# Altium footprint library 20-Switches.PcbLib: 110 footprints (part 2 of 7)
Each footprint in its own frame and in the unit in brackets; x right, y up, seen from the top. Pads: shape width x height; smd on the part's side, far side on the other; paste and mask are expansions set on the pad; w line width, h text height; cw(c..) or ccw(c..) is an arc to the next point about the centre after c.
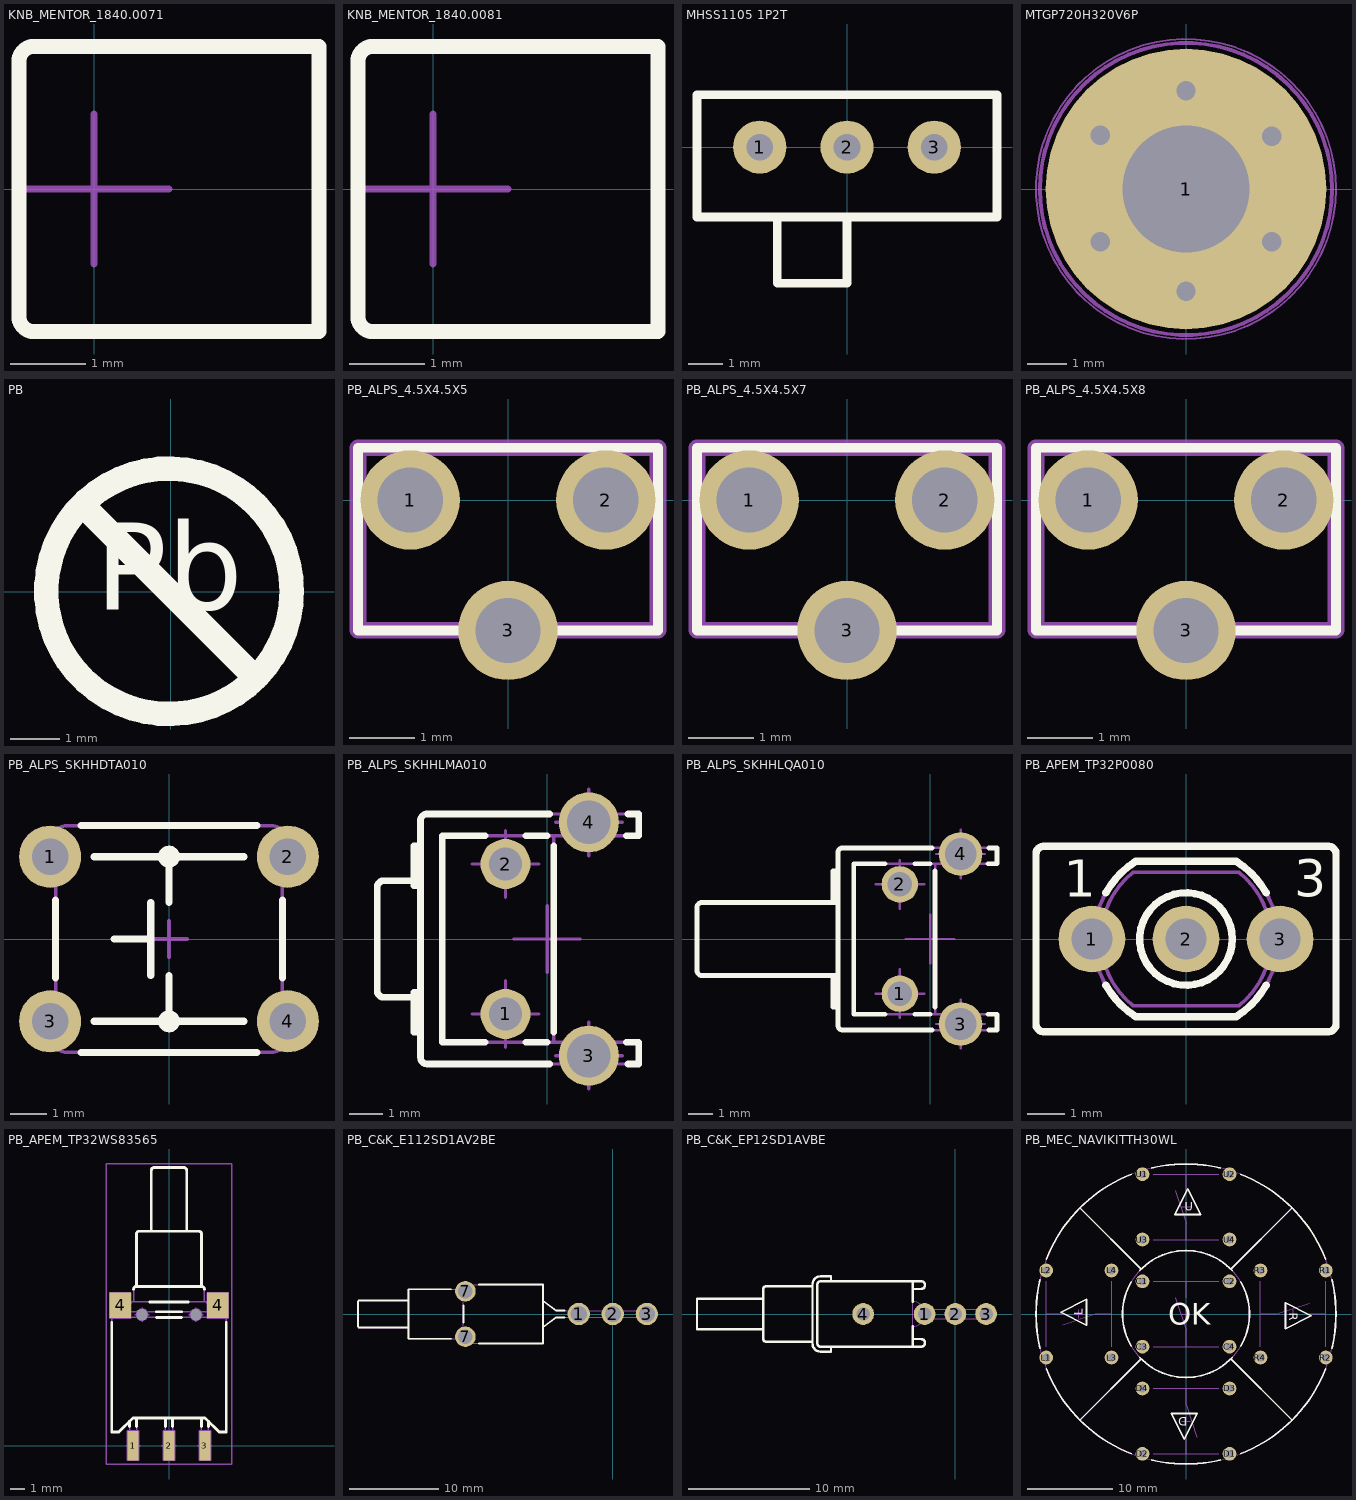
[diagram p1: the footprints below, top view; thin cyan lines are the x and y axes]

## KNB_MENTOR_1840.0071 [mm] "Yellow Knob For MENTOR Push-Button Switch (Dia. 3.8mm L=4mm)"
height 3.8
Top Overlay:
  lines w0.2: -1,-1.7 ccw(c-0.8,-1.7) -0.8,-1.9 3,-1.9 3,1.9 -0.8,1.9 ccw(c-0.8,1.7) -1,1.7 -1,-1.7
Mechanical 8:
  lines w0.1: -1,0 0,0 ; 0,-1 0,0 ; 0,1 0,0 ; 1,0 0,0
Mechanical 14:
  lines w0.1: -1,-1.7 ccw(c-0.8,-1.7) -0.8,-1.9 3,-1.9 3,1.9 -0.8,1.9 ccw(c-0.8,1.7) -1,1.7 -1,-1.7
3D body "KNB_MENTOR_1840.0071.stp": height 6.95, standoff 3.15, extent -1,-1.9 3,1.9

## KNB_MENTOR_1840.0081 [mm] "Green Knob For MENTOR Push-Button Switch (Dia. 3.8mm L=4mm)"
height 3.8
Top Overlay:
  lines w0.2: -1,-1.7 ccw(c-0.8,-1.7) -0.8,-1.9 3,-1.9 3,1.9 -0.8,1.9 ccw(c-0.8,1.7) -1,1.7 -1,-1.7
Mechanical 8:
  lines w0.1: -1,0 0,0 ; 0,-1 0,0 ; 0,1 0,0 ; 1,0 0,0
Mechanical 14:
  lines w0.1: -1,-1.7 ccw(c-0.8,-1.7) -0.8,-1.9 3,-1.9 3,1.9 -0.8,1.9 ccw(c-0.8,1.7) -1,1.7 -1,-1.7
3D body "KNB_MENTOR_1840.0081.stp": height 6.95, standoff 3.15, extent -1,-1.9 3,1.9

## MHSS1105 1P2T [mil]
height 149.61
pads (3):
  round 60 hole 30: 1(-98.43,0) 2(0,0) 3(98.43,0)
Top Overlay:
  lines w10: -78.74,-78.74 -78.74,-153.54 0,-153.54 0,-78.74 ; -169.29,-78.74 -169.29,59.06 169.29,59.06 169.29,-78.74 -169.29,-78.74
3D body "mhss1105-1p2t.stp": height 137.8, standoff -118.11, extent -167.32,-155.5 167.33,61.03

## MTGP720H320V6P [mm]
pads (1):
  round 7.2 hole 3.25: 1(0,0)
via 2.2,-1.35 diameter 1 hole 0.5
via 0,-2.625 diameter 1 hole 0.5
via 2.2,1.35 diameter 1 hole 0.5
via 0,2.525 diameter 1 hole 0.5
via -2.2,1.375 diameter 1 hole 0.5
via -2.2,-1.35 diameter 1 hole 0.5
Mechanical 8:
  circle w0.1: c0,0 r3.75
  circle w0.1: c0,0 r2.6
  lines w0.1: -2.657,1.625 -2.224,1.375 ; -2.632,-1.6 -2.199,-1.35 ; -2.474,0.942 -2.224,1.375 ; -2.449,-0.917 -2.199,-1.35 ; -1.974,1.808 -2.224,1.375 ; -1.949,-1.783 -2.199,-1.35 ; -1.791,1.125 -2.224,1.375 ; -1.766,-1.1 -2.199,-1.35 ; -0.5,-2.625 0,-2.625 ; -0.5,0 0,0 ; -0.5,2.525 0,2.525 ; 0,-3.125 0,-2.625 ; 0,-2.125 0,-2.625 ; 0,-0.5 0,0 ; 0,0.5 0,0 ; 0,2.025 0,2.525 ; 0,3.025 0,2.525 ; 0.5,-2.625 0,-2.625 ; 0.5,0 0,0 ; 0.5,2.525 0,2.525 ; 1.766,-1.1 2.199,-1.35 ; 1.766,1.1 2.199,1.35 ; 1.949,-1.783 2.199,-1.35 ; 1.949,1.783 2.199,1.35 ; 2.449,-0.917 2.199,-1.35 ; 2.449,0.917 2.199,1.35 ; 2.632,-1.6 2.199,-1.35 ; 2.632,1.6 2.199,1.35
Mechanical 14:
  circle w0.1: c0,0 r3.75
Mechanical 15:
  circle w0.05: c0,0 r3.85
3D body "mtgp720h320v6p.stp": height 0.1, standoff -1.75, extent -3.627,-3.627 3.628,3.628

## PB [mm]
Top Overlay:
  circle w0.5: c-0.031,0.013 r2.5
  lines w0.5: -1.737,1.719 1.675,-1.693
  text "Pb" at -1.536,-0.948 h3.05
3D body "pb.stp": height 0.02, standoff 0, extent -2.725,-2.725 2.725,2.725

## PB_ALPS_4.5X4.5X5 [mm]
height 3.8
pads (3):
  round 1.524 hole 1: 1(-1.5,0) 2(1.5,0) 3(0,-2)
Top Overlay:
  lines w0.15: -2.3,-2 2.3,-2 2.3,0.8 -2.3,0.8 -2.3,-2
Mechanical 14:
  lines w0.254: -2.3,-2 -2.3,0.8 2.3,0.8 2.3,-2 -2.3,-2
Mechanical 15:
  lines w0.254: -2.3,-2 2.3,-2 2.3,0.8 -2.3,0.8 -2.3,-2
3D body "4_5x4_5-rj.stp": height 4.5, standoff -1.8, extent -2.25,-4.35 2.25,0.8

## PB_ALPS_4.5X4.5X7 [mm]
height 3.8
pads (3):
  round 1.524 hole 1: 1(-1.5,0) 2(1.5,0) 3(0,-2)
Top Overlay:
  lines w0.15: -2.3,-2 -2.3,0.8 2.3,0.8 2.3,-2 -2.3,-2
Mechanical 14:
  lines w0.254: -2.3,-2 2.3,-2 2.3,0.8 -2.3,0.8 -2.3,-2
Mechanical 15:
  lines w0.254: -2.3,-2 -2.3,0.8 2.3,0.8 2.3,-2 -2.3,-2
3D body "4_5x4_5-rj.stp": height 4.5, standoff -1.8, extent -2.25,-4.35 2.25,0.8

## PB_ALPS_4.5X4.5X8 [mm]
height 3.8
pads (3):
  round 1.524 hole 1: 1(-1.5,0) 2(1.5,0) 3(0,-2)
Top Overlay:
  lines w0.15: -2.3,-2 -2.3,0.8 2.3,0.8 2.3,-2 -2.3,-2
Mechanical 14:
  lines w0.254: -2.3,-2 2.3,-2 2.3,0.8 -2.3,0.8 -2.3,-2
Mechanical 15:
  lines w0.254: -2.3,-2 -2.3,0.8 2.3,0.8 2.3,-2 -2.3,-2
3D body "4_5x4_5-rj.stp": height 4.5, standoff -1.8, extent -2.25,-4.35 2.25,0.8

## PB_ALPS_SKHHDTA010 [mm] "6x6mm Model, 13mm Stem Height Vertical Pushbutton Switch, ALPS SKHH Series"
height 13
pads (4):
  round 1.7 hole 1: 1(-3.25,2.25) 2(3.25,2.25) 3(-3.25,-2.25) 4(3.25,-2.25)
Top Overlay:
  circle w0.2: c0,2.25 r0.2
  circle w0.2: c0,-2.25 r0.2
  lines w0.2: -3.1,-1.059 -3.1,1.059 ; -2.403,-3.1 2.403,-3.1 ; -2.403,3.1 2.403,3.1 ; -2.05,-2.25 2.05,-2.25 ; -2.05,2.25 2.05,2.25 ; -1.5,0 -0.5,0 ; -0.5,-1 -0.5,1 ; 0,-2.25 0,-1 ; 0,1 0,2.25 ; 3.1,-1.059 3.1,1.059
Mechanical 8:
  lines w0.1: -3.75,-2.25 -3.25,-2.25 ; -3.75,2.25 -3.25,2.25 ; -3.25,-2.75 -3.25,-2.25 ; -3.25,-1.75 -3.25,-2.25 ; -3.25,1.75 -3.25,2.25 ; -3.25,2.75 -3.25,2.25 ; -2.75,-2.25 -3.25,-2.25 ; -2.75,2.25 -3.25,2.25 ; -0.5,0 0,0 ; 0,-0.5 0,0 ; 0,0.5 0,0 ; 0.5,0 0,0 ; 2.75,-2.25 3.25,-2.25 ; 2.75,2.25 3.25,2.25 ; 3.25,-2.75 3.25,-2.25 ; 3.25,-1.75 3.25,-2.25 ; 3.25,1.75 3.25,2.25 ; 3.25,2.75 3.25,2.25 ; 3.75,-2.25 3.25,-2.25 ; 3.75,2.25 3.25,2.25
Mechanical 14:
  lines w0.1: -3.1,-2.6 -3.95,-2.6 -3.95,-1.9 -3.1,-1.9 ; -3.1,1.9 -3.95,1.9 -3.95,2.6 -3.096,2.6 ; -2.05,-2.25 2.05,-2.25 ; -2.05,2.25 2.05,2.25 ; -1.5,0 -0.5,0 ; -0.5,-1 -0.5,1 ; 0,-2.25 0,-1 ; 0,1 0,2.25 ; 3.1,-2.6 3.95,-2.6 3.95,-1.9 3.1,-1.9 ; 3.1,1.9 3.95,1.9 3.95,2.6 3.1,2.6 ; -3.1,-2.8 ccw(c-2.8,-2.8) -2.8,-3.1 2.8,-3.1 ccw(c2.8,-2.8) 3.1,-2.8 3.1,2.8 ccw(c2.8,2.8) 2.8,3.1 -2.8,3.1 ccw(c-2.8,2.8) -3.1,2.8 -3.1,-2.8
3D body "PB_ALPS_SKHHDTA010.stp": height 13, standoff -3.5, extent -3.95,-3.1 3.95,3.1

## PB_ALPS_SKHHLMA010 [mm] "Body 6x6mm, Stem height 3.85mm, Horizontal Pushbutton Switch, ALPS Serie SKHH"
height 7.4
pads (4):
  round 1.5 hole 1: 1(-1.25,-2.25) 2(-1.25,2.25)
  round 1.8 hole 1.3: 3(1.25,-3.5) 4(1.25,3.5)
Top Overlay:
  lines w0.2: -4,-1.75 -4.9,-1.75 cw(c-4.9,-1.55) -5.1,-1.55 -5.1,1.55 cw(c-4.9,1.55) -4.9,1.75 -4,1.75 ; -3.8,-2.8 -4,-2.8 -4,-1.6 -3.8,-1.6 ; -3.8,1.6 -4,1.6 -4,2.8 -3.8,2.8 ; -1.866,-3.1 -3.15,-3.1 -3.15,3.1 -1.866,3.1 ; -0.634,-3.1 0,-3.1 ; -0.634,3.1 0,3.1 ; 0.076,-3.75 -3.6,-3.75 cw(c-3.6,-3.55) -3.8,-3.55 -3.8,3.55 cw(c-3.6,3.55) -3.6,3.75 0.076,3.75 ; 0.2,-2.8 0.2,2.8 ; 2.381,-3.1 2.75,-3.1 2.75,-3.75 2.424,-3.75 ; 2.381,3.1 2.75,3.1 2.75,3.75 2.424,3.75
Mechanical 8:
  lines w0.1: -2.25,-2.25 -1.25,-2.25 ; -2.25,2.25 -1.25,2.25 ; -1.25,-3.25 -1.25,-2.25 ; -1.25,-1.25 -1.25,-2.25 ; -1.25,1.25 -1.25,2.25 ; -1.25,3.25 -1.25,2.25 ; -1,0 0,0 ; -0.25,-2.25 -1.25,-2.25 ; -0.25,2.25 -1.25,2.25 ; 0,-1 0,0 ; 0,1 0,0 ; 0.25,-3.5 1.25,-3.5 ; 0.25,3.5 1.25,3.5 ; 1,0 0,0 ; 1.25,-4.5 1.25,-3.5 ; 1.25,-2.5 1.25,-3.5 ; 1.25,2.5 1.25,3.5 ; 1.25,4.5 1.25,3.5 ; 2.25,-3.5 1.25,-3.5 ; 2.25,3.5 1.25,3.5
Mechanical 14:
  lines w0.1: -4,-1.75 -4.9,-1.75 cw(c-4.9,-1.55) -5.1,-1.55 -5.1,1.55 cw(c-4.9,1.55) -4.9,1.75 -4,1.75 ; -3.8,-2.8 -4,-2.8 -4,-1.6 -3.8,-1.6 ; -3.8,1.6 -4,1.6 -4,2.8 -3.8,2.8 ; 0.2,-3.1 -3.15,-3.1 -3.15,3.1 0.2,3.1 ; 0.2,-3.1 2.75,-3.1 2.75,-3.75 -3.6,-3.75 cw(c-3.6,-3.55) -3.8,-3.55 -3.8,3.55 cw(c-3.6,3.55) -3.6,3.75 2.75,3.75 2.75,3.1 0.2,3.1 ; 0.2,-3.1 0.2,3.1
3D body "PB_ALPS_SKHHLMA010.stp": height 7.1, standoff -3.5, extent -5.1,-3.75 2.75,3.75

## PB_ALPS_SKHHLQA010 [mm] "Body 6x6mm, Stem height 8.35mm, Horizontal Pushbutton Switch, ALPS Serie SKHH"
height 7.4
pads (4):
  round 1.5 hole 1: 1(-1.25,-2.25) 2(-1.25,2.25)
  round 1.8 hole 1.3: 3(1.25,-3.5) 4(1.25,3.5)
Top Overlay:
  lines w0.2: -9.6,1.27 -9.6,-1.3 ccw(c-9.4,-1.3) -9.4,-1.5 -3.8,-1.5 ; -9.6,1.3 cw(c-9.4,1.3) -9.4,1.5 -3.8,1.5 ; -3.8,-2.8 -4,-2.8 -4,-1.6 -3.8,-1.6 ; -3.8,1.6 -4,1.6 -4,2.8 -3.8,2.8 ; -1.866,-3.1 -3.15,-3.1 -3.15,3.1 -1.866,3.1 ; -0.634,-3.1 0,-3.1 ; -0.634,3.1 0,3.1 ; 0.076,-3.75 -3.6,-3.75 cw(c-3.6,-3.55) -3.8,-3.55 -3.8,3.55 cw(c-3.6,3.55) -3.6,3.75 0.076,3.75 ; 0.2,-2.8 0.2,2.8 ; 2.381,-3.1 2.75,-3.1 2.75,-3.75 2.424,-3.75 ; 2.381,3.1 2.75,3.1 2.75,3.75 2.424,3.75
Mechanical 8:
  lines w0.1: -2.25,-2.25 -1.25,-2.25 ; -2.25,2.25 -1.25,2.25 ; -1.25,-3.25 -1.25,-2.25 ; -1.25,-1.25 -1.25,-2.25 ; -1.25,1.25 -1.25,2.25 ; -1.25,3.25 -1.25,2.25 ; -1,0 0,0 ; -0.25,-2.25 -1.25,-2.25 ; -0.25,2.25 -1.25,2.25 ; 0,-1 0,0 ; 0,1 0,0 ; 0.25,-3.5 1.25,-3.5 ; 0.25,3.5 1.25,3.5 ; 1,0 0,0 ; 1.25,-4.5 1.25,-3.5 ; 1.25,-2.5 1.25,-3.5 ; 1.25,2.5 1.25,3.5 ; 1.25,4.5 1.25,3.5 ; 2.25,-3.5 1.25,-3.5 ; 2.25,3.5 1.25,3.5
Mechanical 14:
  lines w0.1: -3.8,-2.8 -4,-2.8 -4,-1.6 -3.8,-1.6 ; -3.8,-1.5 -9.4,-1.5 cw(c-9.4,-1.3) -9.6,-1.3 -9.6,1.3 cw(c-9.4,1.3) -9.4,1.5 -3.8,1.5 ; -3.8,1.6 -4,1.6 -4,2.8 -3.8,2.8 ; 0.2,-3.1 0.2,3.1 ; 0.2,-3.1 2.75,-3.1 2.75,-3.75 -3.6,-3.75 cw(c-3.6,-3.55) -3.8,-3.55 -3.8,3.55 cw(c-3.6,3.55) -3.6,3.75 2.75,3.75 2.75,3.1 0.2,3.1 ; 0.2,-3.1 -3.15,-3.1 -3.15,3.1 0.2,3.1
3D body "PB_ALPS_SKHHLQA010.stp": height 7.1, standoff -3.5, extent -9.6,-3.75 2.75,3.75

## PB_APEM_TP32P0080 [mm] "SPDT Momentary Push-Button Switch - Straight PCB - APEM TP Serie"
height 17.75
pads (3):
  round 1.8 hole 1.1: 1(-2.54,0) 2(0,0) 3(2.54,0)
Top Overlay:
  circle w0.2: c0,0 r1.25
  lines w0.2: -2.168,-1.246 ccw(c0,0) -1.356,-2.1 1.356,-2.1 ccw(c0,0) 2.168,-1.246 ; -2.168,1.246 cw(c0,0) -1.356,2.1 1.356,2.1 cw(c0,0) 2.168,1.246 ; -4.05,-2.3 ccw(c-3.85,-2.3) -3.85,-2.5 3.85,-2.5 ccw(c3.85,-2.3) 4.05,-2.3 4.05,2.3 ccw(c3.85,2.3) 3.85,2.5 -3.85,2.5 ccw(c-3.85,2.3) -4.05,2.3 -4.05,-2.3
  text "1" at -3.302,1.143 h1
  text "3" at 2.921,1.143 h1
Mechanical 8:
  lines w0.1: -3.04,0 -2.54,0 ; -2.54,-0.5 -2.54,0 ; -2.54,0.5 -2.54,0 ; -2.04,0 -2.54,0 ; -0.5,0 0,0 ; 0,-0.5 0,0 ; 0,0.5 0,0 ; 0.5,0 0,0 ; 2.04,0 2.54,0 ; 2.54,-0.5 2.54,0 ; 2.54,0.5 2.54,0 ; 3.04,0 2.54,0
Mechanical 14:
  circle w0.1: c0,0 r1.25
  lines w0.1: -4.05,-2.3 ccw(c-3.85,-2.3) -3.85,-2.5 3.85,-2.5 ccw(c3.85,-2.3) 4.05,-2.3 4.05,2.3 ccw(c3.85,2.3) 3.85,2.5 -3.85,2.5 ccw(c-3.85,2.3) -4.05,2.3 -4.05,-2.3 ; -1.432,-1.8 cw(c0,0) -1.432,1.8 1.432,1.8 cw(c0,0) 1.432,-1.8 -1.432,-1.8 ; -1.356,-2.1 cw(c0,0) -1.356,2.1 1.356,2.1 cw(c0,0) 1.356,-2.1 -1.356,-2.1
  text "1" at -3.303,1.144 h1
  text "3" at 2.92,1.144 h1
3D body "PB_APEM_TP32P0080.stp": height 17.75, standoff -3.3, extent -4.05,-2.5 4.05,2.5

## PB_APEM_TP32WS83565 [mm] "Horizontal Surface Mount Tiny Washable Pushbutton Switches With Positioning Pins, APEM TP Series"
height 5.55
pads (7):
  rect 0.8x2.1 smd: 1(-2.54,0) 2(0,0) 3(2.54,0)
  rect 1.5x1.8 smd: 4(-3.45,9.91) 4(3.45,9.91)
  round 0.5 hole 0.8 unplated: MEC(-1.905,9.26) MEC(1.905,9.26)
Top Overlay:
  lines w0.2: -4.05,8.71 -4.05,0.96 -3.55,0.96 -2.55,1.96 2.55,1.96 3.55,0.96 4.05,0.96 4.05,8.71 ; -2.79,1.35 -2.79,1.72 ; -2.5,11.06 cw(c-2.3,11.06) -2.3,11.26 ; -2.29,1.35 -2.29,1.953 ; -1.364,10.16 1.364,10.16 ; -1.25,15.16 -1.25,19.46 cw(c-1.05,19.46) -1.05,19.66 1.05,19.66 cw(c1.05,19.46) 1.25,19.46 1.25,15.16 ; -0.874,9.06 0.874,9.06 ; -0.874,9.46 0.874,9.46 ; -0.25,1.35 -0.25,1.953 ; 0.25,1.35 0.25,1.953 ; 2.29,1.35 2.29,1.953 ; 2.5,11.06 ccw(c2.3,11.06) 2.3,11.26 ; 2.79,1.35 2.79,1.72 ; -2.3,11.26 2.3,11.26 ; -2.3,11.26 -2.3,14.96 cw(c-2.1,14.96) -2.1,15.16 2.1,15.16 cw(c2.1,14.96) 2.3,14.96 2.3,11.26
Mechanical 8:
  circle w0.1: c1.905,9.26 r0.4
  circle w0.1: c-1.905,9.26 r0.4
  lines w0.1: -3.95,9.91 -3.45,9.91 ; -3.45,9.41 -3.45,9.91 ; -3.45,10.41 -3.45,9.91 ; -3.04,0 -2.54,0 ; -2.95,9.91 -3.45,9.91 ; -2.54,-0.5 -2.54,0 ; -2.54,0.5 -2.54,0 ; -2.405,9.26 -1.905,9.26 ; -2.04,0 -2.54,0 ; -1.905,8.76 -1.905,9.26 ; -1.905,9.76 -1.905,9.26 ; -1.405,9.26 -1.905,9.26 ; -0.5,0 0,0 ; 0,-0.5 0,0 ; 0,0.5 0,0 ; 0.5,0 0,0 ; 1.405,9.26 1.905,9.26 ; 1.905,8.76 1.905,9.26 ; 1.905,9.76 1.905,9.26 ; 2.04,0 2.54,0 ; 2.405,9.26 1.905,9.26 ; 2.54,-0.5 2.54,0 ; 2.54,0.5 2.54,0 ; 2.95,9.91 3.45,9.91 ; 3.04,0 2.54,0 ; 3.45,9.41 3.45,9.91 ; 3.45,10.41 3.45,9.91 ; 3.95,9.91 3.45,9.91 ; -4.2,9.01 -4.2,10.81 -2.7,10.81 -2.7,9.01 -4.2,9.01 ; -2.94,-1.05 -2.94,1.05 -2.14,1.05 -2.14,-1.05 -2.94,-1.05 ; -0.4,-1.05 0.4,-1.05 0.4,1.05 -0.4,1.05 -0.4,-1.05 ; 2.14,-1.05 2.94,-1.05 2.94,1.05 2.14,1.05 2.14,-1.05 ; 2.7,9.01 2.7,10.81 4.2,10.81 4.2,9.01 2.7,9.01
Mechanical 14:
  lines w0.1: -4.05,8.859 cw(c-3.85,8.86) -3.85,9.06 ; -4.05,8.86 -4.05,0.96 -3.55,0.96 -2.55,1.96 2.55,1.96 3.55,0.96 4.05,0.96 4.05,8.86 ; -3.95,9.46 3.95,9.46 ; -2.95,9.46 -2.95,10.56 -3.95,10.56 -3.95,9.06 3.95,9.06 3.95,10.56 2.95,10.56 2.95,9.46 ; -2.85,9.46 -2.65,10.16 2.65,10.16 2.85,9.46 ; -2.79,1.72 -2.79,-0.799 -2.29,-0.799 -2.29,1.953 ; -2.5,10.16 -2.5,11.06 cw(c-2.3,11.06) -2.3,11.26 ; -1.25,15.16 -1.25,19.46 cw(c-1.05,19.46) -1.05,19.66 1.05,19.66 cw(c1.05,19.46) 1.25,19.46 1.25,15.16 ; -0.25,1.953 -0.25,-0.799 0.25,-0.799 0.25,1.953 ; 2.29,1.953 2.29,-0.799 2.79,-0.799 2.79,1.72 ; 2.5,10.16 2.5,11.06 ccw(c2.3,11.06) 2.3,11.26 ; 3.85,9.06 cw(c3.85,8.86) 4.05,8.859 ; -2.3,11.26 2.3,11.26 ; -2.3,11.26 -2.3,14.96 cw(c-2.1,14.96) -2.1,15.16 2.1,15.16 cw(c2.1,14.96) 2.3,14.96 2.3,11.26
Mechanical 15:
  lines w0.1: -4.45,-1.3 4.45,-1.3 4.45,19.91 -4.45,19.91 -4.45,-1.3
3D body "PB_APEM_TP32WS83565.stp": height 5.6, standoff -1, extent -4.05,-0.799 4.05,19.66

## PB_C&K_E112SD1AV2BE [mm] "SPDT Toggle Switch - Vertical Right Angled PCB Mounting, Unthreaded Bushing, C&K E010 Series"
height 12.7
pads (5):
  round 2.5 hole 1.8: 1(-3.81,0) 2(0,0) 3(3.81,0)
  round 2.3 hole 1.6: 7(-16.51,-2.54) 7(-16.51,2.54)
Top Overlay:
  lines w0.2: -22.885,-1.525 -28.425,-1.525 -28.525,-1.425 -28.525,1.425 -28.425,1.525 -22.885,1.525 ; -18.092,-2.78 -22.885,-2.78 ; -18.092,2.78 -22.885,2.78 ; -16.715,-0.953 -16.715,0.953 ; -14.986,-3.3 -7.825,-3.3 -7.825,3.3 -14.986,3.3 ; -7.825,-1.5 -6.332,-0.38 -5.416,-0.38 ; -7.825,1.5 -6.332,0.38 -5.416,0.38 ; -22.885,-2.78 -22.885,2.78 ; -22.885,-2.78 -22.885,2.78
Mechanical 8:
  lines w0.1: -17.51,-2.54 -16.51,-2.54 ; -17.51,2.54 -16.51,2.54 ; -16.51,-3.54 -16.51,-2.54 ; -16.51,-1.54 -16.51,-2.54 ; -16.51,1.54 -16.51,2.54 ; -16.51,3.54 -16.51,2.54 ; -15.51,-2.54 -16.51,-2.54 ; -15.51,2.54 -16.51,2.54 ; -4.81,0 -3.81,0 ; -3.81,-1 -3.81,0 ; -3.81,1 -3.81,0 ; -2.81,0 -3.81,0 ; -1,0 0,0 ; 0,-1 0,0 ; 0,1 0,0 ; 1,0 0,0 ; 2.81,0 3.81,0 ; 3.81,-1 3.81,0 ; 3.81,1 3.81,0 ; 4.81,0 3.81,0
Mechanical 14:
  lines w0.1: -22.885,-1.525 -28.425,-1.525 -28.525,-1.425 -28.525,1.425 -28.425,1.525 -22.885,1.525 ; -16.715,-2.78 -22.885,-2.78 ; -16.715,2.78 -22.885,2.78 ; -7.825,-1.5 -6.332,-0.38 4.445,-0.38 4.445,0.38 -6.332,0.38 -7.825,1.5 ; -22.885,-2.78 -22.885,2.78 ; -22.885,-2.78 -22.885,2.78 ; -16.715,-3.3 -7.825,-3.3 -7.825,3.3 -16.715,3.3 -16.715,-3.3
3D body "PB_C&K_E112SD1AV2BE.stp": height 12.7, standoff -3.18, extent -28.525,-3.3 4.445,3.3

## PB_C&K_EP12SD1AVBE [mm] "SPDT Sealed Tiny Pushbutton Switch, Vertical Right Angled PCB Mounting, Unthreaded Bushing, EP Series"
height 8.77
pads (4):
  round 1.8 hole 1.1: 1(-2.54,0) 2(0,0) 3(2.54,0) 4(-7.62,0)
Top Overlay:
  lines w0.2: -15.9,-1.27 -21.36,-1.27 -21.36,1.27 -15.9,1.27 ; -11.81,-2.285 -15.646,-2.285 cw(c-15.646,-2.031) -15.9,-2.031 -15.9,2.031 cw(c-15.646,2.031) -15.646,2.285 -11.81,2.285 ; -10.286,-2.704 -10.286,-3.11 -11.15,-3.11 cw(c-11.15,-2.45) -11.81,-2.45 -11.81,2.45 cw(c-11.15,2.45) -11.15,3.11 -10.286,3.11 -10.286,2.704 ; -3.526,-2.704 -3.526,-0.994 ; -3.526,-2.069 -2.828,-2.069 cw(c-2.828,-2.386) -2.828,-2.704 -11.15,-2.704 cw(c-11.15,-2.45) -11.404,-2.45 -11.404,2.45 cw(c-11.15,2.45) -11.15,2.704 -2.828,2.704 cw(c-2.828,2.386) -2.828,2.069 -3.526,2.069 ; -3.526,0.994 -3.526,2.704
Mechanical 8:
  lines w0.05: -8.12,0 -7.62,0 ; -7.62,-0.5 -7.62,0 ; -7.62,0.5 -7.62,0 ; -7.12,0 -7.62,0 ; -3.04,0 -2.54,0 ; -2.54,-0.5 -2.54,0 ; -2.54,0.5 -2.54,0 ; -2.04,0 -2.54,0 ; -0.5,0 0,0 ; 0,-0.5 0,0 ; 0,0.5 0,0 ; 0.5,0 0,0 ; 2.04,0 2.54,0 ; 2.54,-0.5 2.54,0 ; 2.54,0.5 2.54,0 ; 3.04,0 2.54,0
Mechanical 14:
  lines w0.1: -15.9,-1.27 -21.36,-1.27 -21.36,1.27 -15.9,1.27 ; -11.81,-2.285 -15.646,-2.285 cw(c-15.646,-2.031) -15.9,-2.031 -15.9,2.031 cw(c-15.646,2.031) -15.646,2.285 -11.81,2.285 ; -10.286,-2.704 -10.286,-3.11 -11.15,-3.11 cw(c-11.15,-2.45) -11.81,-2.45 -11.81,2.45 cw(c-11.15,2.45) -11.15,3.11 -10.286,3.11 -10.286,2.704 ; -3.526,-2.704 -3.526,2.704 ; -3.526,-2.069 -2.828,-2.069 cw(c-2.828,-2.386) -2.828,-2.704 -11.15,-2.704 cw(c-11.15,-2.45) -11.404,-2.45 -11.404,2.45 cw(c-11.15,2.45) -11.15,2.704 -2.828,2.704 cw(c-2.828,2.386) -2.828,2.069 -3.526,2.069 ; -3.526,-1.016 ccw(c-3.526,0) -3.526,1.016 ; -2.584,-0.38 2.794,-0.38 2.794,0.381 ; -2.584,0.38 2.795,0.38
3D body "PB_C&K_EP12SD1AVBE.stp": height 8.76, standoff -3.3, extent -21.36,-3.11 2.794,3.11

## PB_MEC_NAVIKITTH30WL [mm] "Navigation Switch Navimec, 4 x 1ZB Keycaps on 3A Switches And 1 x 1ZC on 3F Switches, Blue Color"
height 12.2
pads (20):
  round 1.6 hole 0.9: C1(-5.08,3.81) C2(5.08,3.81) C3(-5.08,-3.81) C4(5.08,-3.81) D1(5.08,-16.31) D2(-5.08,-16.31) D3(5.08,-8.69) D4(-5.08,-8.69) L1(-16.31,-5.08) L2(-16.31,5.08) L3(-8.69,-5.08) L4(-8.69,5.08) R1(16.31,5.08) R2(16.31,-5.08) R3(8.69,5.08) R4(8.69,-5.08) U1(-5.08,16.31) U2(5.08,16.31) U3(-5.08,8.69) U4(5.08,8.69)
Top Overlay:
  lines w0.2: -17.036,-4.002 cw(c0,0) -17.036,4.002 ; -16.296,-6.38 ccw(c0,0) -6.38,-16.296 ; -16.296,6.38 cw(c0,0) -6.38,16.296 ; -12.374,-12.374 -5.233,-5.233 ; -12.374,12.374 -5.233,5.233 ; -6.379,-3.751 cw(c0,0) -6.379,3.751 ; -5.387,-5.073 ccw(c0,0) 5.387,-5.073 ; -5.387,5.073 cw(c0,0) 5.387,5.073 ; -4.002,-17.036 ccw(c0,0) 4.002,-17.036 ; -4.002,17.036 cw(c0,0) 4.002,17.036 ; 5.233,-5.233 12.374,-12.374 ; 5.233,5.233 12.374,12.374 ; 6.379,-3.751 ccw(c0,0) 6.379,3.751 ; 6.38,-16.296 ccw(c0,0) 16.296,-6.38 ; 6.38,16.296 cw(c0,0) 16.296,6.38 ; 17.036,-4.002 ccw(c0,0) 17.036,4.002 ; -14.604,0.208 -11.604,1.708 -11.604,-1.292 -14.604,0.208 ; -1.708,-11.604 1.292,-11.604 -0.208,-14.604 -1.708,-11.604 ; -1.292,11.604 0.208,14.604 1.708,11.604 -1.292,11.604 ; 11.604,-1.708 14.604,-0.208 11.604,1.292 11.604,-1.708
  text "OK" at -2.055,-1.25 h2.5
  text "U" at -0.125,12.05 h1
  text "R" at 12.05,0.125 h1
  text "L" at -12.05,-0.125 h1
  text "D" at 0.125,-12.05 h1
Mechanical 8:
  lines w0.1: -16.81,-5.08 -16.31,-5.08 ; -16.81,5.08 -16.31,5.08 ; -16.31,-5.58 -16.31,-5.08 ; -16.31,-4.58 -16.31,-5.08 ; -16.31,-3.81 -16.31,3.81 ; -16.31,0 -14.405,0 ; -16.31,4.58 -16.31,5.08 ; -16.31,5.58 -16.31,5.08 ; -15.81,-5.08 -16.31,-5.08 ; -15.81,5.08 -16.31,5.08 ; -14.405,-1.27 -10.595,0 -8.69,0 ; -13,0 -12.5,0 ; -12.5,-0.5 -12.5,0 ; -12.5,0.5 -12.5,0 ; -12,0 -12.5,0 ; -9.19,-5.08 -8.69,-5.08 ; -9.19,5.08 -8.69,5.08 ; -8.69,-5.58 -8.69,-5.08 ; -8.69,-4.58 -8.69,-5.08 ; -8.69,-3.81 -8.69,3.81 ; -8.69,4.58 -8.69,5.08 ; -8.69,5.58 -8.69,5.08 ; -8.19,-5.08 -8.69,-5.08 ; -8.19,5.08 -8.69,5.08 ; -5.58,-16.31 -5.08,-16.31 ; -5.58,-8.69 -5.08,-8.69 ; -5.58,-3.81 -5.08,-3.81 ; -5.58,3.81 -5.08,3.81 ; -5.58,8.69 -5.08,8.69 ; -5.58,16.31 -5.08,16.31 ; -5.08,-16.81 -5.08,-16.31 ; -5.08,-15.81 -5.08,-16.31 ; -5.08,-9.19 -5.08,-8.69 ; -5.08,-8.19 -5.08,-8.69 ; -5.08,-4.31 -5.08,-3.81 ; -5.08,-3.31 -5.08,-3.81 ; -5.08,3.31 -5.08,3.81 ; -5.08,4.31 -5.08,3.81 ; -5.08,8.19 -5.08,8.69 ; -5.08,9.19 -5.08,8.69 ; -5.08,15.81 -5.08,16.31 ; -5.08,16.81 -5.08,16.31 ; -4.58,-16.31 -5.08,-16.31 ; -4.58,-8.69 -5.08,-8.69 ; -4.58,-3.81 -5.08,-3.81 ; -4.58,3.81 -5.08,3.81 ; -4.58,8.69 -5.08,8.69 ; -4.58,16.31 -5.08,16.31 ; -3.81,-16.31 3.81,-16.31 ; -3.81,-8.69 3.81,-8.69 ; -3.81,-3.81 3.81,-3.81 ; -3.81,3.81 3.81,3.81 ; -3.81,8.69 3.81,8.69 ; -3.81,16.31 3.81,16.31 ; -1.27,1.905 0,-1.905 0,-3.81 ; -1.27,14.405 0,10.595 0,8.69 ; -0.5,-12.5 0,-12.5 ; -0.5,0 0,0 ; -0.5,12.5 0,12.5 ; 0,-16.31 0,-14.405 ; 0,-13 0,-12.5 ; 0,-12 0,-12.5 ; 0,-8.69 0,-10.595 1.27,-14.405 ; 0,-0.5 0,0 ; 0,0.5 0,0 ; 0,1.905 0,3.81 ; 0,12 0,12.5 ; 0,13 0,12.5 ; 0,14.405 0,16.31 ; 0.5,-12.5 0,-12.5 ; 0.5,0 0,0 ; 0.5,12.5 0,12.5 ; 4.58,-16.31 5.08,-16.31 ; 4.58,-8.69 5.08,-8.69 ; 4.58,-3.81 5.08,-3.81 ; 4.58,3.81 5.08,3.81 ; 4.58,8.69 5.08,8.69 ; 4.58,16.31 5.08,16.31 ; 5.08,-16.81 5.08,-16.31 ; 5.08,-15.81 5.08,-16.31 ; 5.08,-9.19 5.08,-8.69 ; 5.08,-8.19 5.08,-8.69 ; 5.08,-4.31 5.08,-3.81 ; 5.08,-3.31 5.08,-3.81 ; 5.08,3.31 5.08,3.81 ; 5.08,4.31 5.08,3.81 ; 5.08,8.19 5.08,8.69 ; 5.08,9.19 5.08,8.69 ; 5.08,15.81 5.08,16.31 ; 5.08,16.81 5.08,16.31 ; 5.58,-16.31 5.08,-16.31 ; 5.58,-8.69 5.08,-8.69 ; 5.58,-3.81 5.08,-3.81 ; 5.58,3.81 5.08,3.81 ; 5.58,8.69 5.08,8.69 ; 5.58,16.31 5.08,16.31 ; 8.19,-5.08 8.69,-5.08 ; 8.19,5.08 8.69,5.08 ; 8.69,-5.58 8.69,-5.08 ; 8.69,-4.58 8.69,-5.08 ; 8.69,-3.81 8.69,3.81 ; 8.69,0 10.595,0 14.405,1.27 ; 8.69,4.58 8.69,5.08 ; 8.69,5.58 8.69,5.08 ; 9.19,-5.08 8.69,-5.08 ; 9.19,5.08 8.69,5.08 ; 14.405,0 16.31,0 ; 15.81,-5.08 16.31,-5.08 ; 15.81,5.08 16.31,5.08 ; 16.31,-5.58 16.31,-5.08 ; 16.31,-4.58 16.31,-5.08 ; 16.31,-3.81 16.31,3.81 ; 16.31,4.58 16.31,5.08 ; 16.31,5.58 16.31,5.08 ; 16.81,-5.08 16.31,-5.08 ; 16.81,5.08 16.31,5.08 ; 12.5,0 12,0 12.5,0 ; 12.5,0 12.5,-0.5 12.5,0 ; 12.5,0 13,0 12.5,0 ; 12.5,0 12.5,0.5 12.5,0
  text "1" at 4.248,-14.605 h1
  text "2" at -3.372,-14.605 h1
  text "4" at -3.372,-9.525 h1
  text "3" at 4.248,-9.525 h1
  text "1" at 14.605,4.248 h1
  text "2" at 14.605,-3.372 h1
  text "4" at 9.525,-3.372 h1
  text "3" at 9.525,4.248 h1
  text "1" at -14.605,-4.248 h1
  text "2" at -14.605,3.372 h1
  text "4" at -9.525,3.372 h1
  text "3" at -9.525,-4.248 h1
  text "1" at -4.248,2.105 h1
  text "2" at 3.372,2.105 h1
  text "4" at 3.372,-2.975 h1
  text "3" at -4.248,-2.975 h1
  text "1" at -4.248,14.605 h1
  text "2" at 3.372,14.605 h1
  text "4" at 3.372,9.525 h1
  text "3" at -4.248,9.525 h1
Mechanical 14:
  circle w0.1: c0,0 r7.4
  circle w0.1: c0,0 r17.5
  lines w0.1: -12.374,-12.374 -5.233,-5.233 ; -12.374,12.374 -5.233,5.233 ; 5.233,-5.233 12.374,-12.374 ; 5.233,5.233 12.374,12.374 ; -14.604,0.208 -11.604,1.708 -11.604,-1.292 -14.604,0.208 ; -1.708,-11.604 1.292,-11.604 -0.208,-14.604 -1.708,-11.604 ; -1.292,11.604 0.208,14.604 1.708,11.604 -1.292,11.604 ; 11.604,-1.708 14.604,-0.208 11.604,1.292 11.604,-1.708
  text "OK" at -2.055,-1.25 h2.5
3D body "PB_MEC_NAVIKITTH30WL.stp": height 12.22, standoff -4, extent -17.5,-17.5 17.5,17.5